# Altium schematic symbol library Electronic Devices_LIB.SchLib: 703 symbols (part 6 of 8) (continued)
## PROT_FUSES_1.5A_32V_0603_F0603E1R50FSTR
designator F?, comment F0603E1R50FSTR
F0603E Series Fast Acting 32 V 1.5 A 0603 Surface Mount Thin-Film Fuse; Manufacturer: Kyocera AVX; Current Rating: 1.5A; Voltage Rating (DC): 32V; Resistance: 60mR; Fuse Type: Board Mount (Cartridge Style Excluded); Approvals: UL; Supplier 1: Digi-Key; Manufacturer Part Number: F0603E1R50FSTR; RoHS: Yes; Category: Fuses; Stock 1: 29130; Pricing 1: 1=0.37, 5=0.362, 10=0.35, 50=0.2944, 100=0.2444, 250=0.2222, 500=0.18888, 1000=0.16665 (USD); Mount: Surface Mount; Case/Package: 0603; Number of Pins: 2; Case Code (Metric): 1608; Case Code (Imperial): 0603; Terminal Material: Nickel; Min Operating Temperature: -55°C; Max Operating Temperature: 125°C; Max Voltage Rating (DC): 32V; Series: Accu-Guard® II; Packaging: Tape and Reel; Voltage Rating: 32V; Package Quantity: 3000; Termination: SMD/SMT; DC Cold Resistance: 60mR; Voltage Rating (AC): 32V; Length: 1.6mm; Width: 0.81mm; Height: 0.63mm; Depth: 0.81mm; Radiation Hardening: No; Lead Free: Lead Free; RoHS Compliant: Yes; ComponentLink1URL: https://datasheet.ciiva.com/301/accug2-301336.pdf?src-supplier=Digi-Key; ComponentLink1Description: https://datasheet.ciiva.com/301/accug2-301336.pdf?src-supplier=Digi-Key; ComponentLink2URL: https://datasheet.ciiva.com/301/accug2-301337.pdf?src-supplier=Digi-Key; ComponentLink2Description: https://datasheet.ciiva.com/301/accug2-301337.pdf?src-supplier=Digi-Key; ComponentLink3URL: https://datasheet.ciiva.com/301/accug2-301338.pdf?src-supplier=Digi-Key; ComponentLink3Description: https://datasheet.ciiva.com/301/accug2-301338.pdf?src-supplier=Digi-Key; ComponentLink4URL: https://datasheet.ciiva.com/3017/fuses-3017734.pdf?src-supplier=Avnet; ComponentLink4Description: https://datasheet.ciiva.com/3017/fuses-3017734.pdf?src-supplier=Avnet; ComponentLink5URL: https://datasheet.ciiva.com/30017/fuses-30017246.pdf?src-supplier=Avnet; ComponentLink5Description: https://datasheet.ciiva.com/30017/fuses-30017246.pdf?src-supplier=Avnet; Supplier Part Number 1: 478-2864-1-ND
footprint PROT_FUSE_FUSC1608X71N (SMD 0603 (1.60mm x 0.81mm x 0.63mm)
pins: 1, 2

## PROT_FUSES_32V_7A_0440007.WR
designator F?, comment 0440007.WR
Fuse Chip Fast Acting 7A 32V SMD Solder Pad 1206 Ceramic T/R CSA/UL; Manufacturer: Littelfuse; Fuse Type: Board Mount (Cartridge Style Excluded); Resistance: 7.94mR; DC Cold Resistance: 7.53mR; Supplier 1: Digikey; Manufacturer Part Number: 0440007.WR; RoHS: Yes; Category: Fuses; Stock 1: 4696; Pricing 1: 1=1.09, 5=1.056, 10=0.989, 50=0.818, 100=0.6818, 250=0.66472, 500=0.56244, 1000=0.49427 (USD); Mount: Surface Mount; Case/Package: 1206; Case Code (Metric): 3216; Case Code (Imperial): 1206; Body Material: Ceramic; Terminal Material: Nickel; Min Operating Temperature: -55°C; Max Operating Temperature: 150°C; Voltage Rating (AC): 32V; Voltage Rating (DC): 32V; Packaging: Tape and Reel; Series: 440; Package Quantity: 3000; Current Rating: 7A; Voltage Rating: 32V; Termination: SMD/SMT; Fuse Current: 7A; Length: 3.2mm; Width: 1.63mm; Height: 0.8mm; RoHS Compliant: Yes; Reach SVHC Compliant: No; ComponentLink1URL: https://datasheet.ciiva.com/299/littelfuse-fuse-440-datasheet-299438.pdf?src-supplier=Digikey; ComponentLink1Description: https://datasheet.ciiva.com/299/littelfuse-fuse-440-datasheet-299438.pdf?src-supplier=Digikey; ComponentLink2URL: https://datasheet.ciiva.com/299/littelfuse-fuse-440-datasheet-299439.pdf?src-supplier=Digikey; ComponentLink2Description: https://datasheet.ciiva.com/299/littelfuse-fuse-440-datasheet-299439.pdf?src-supplier=Digikey; ComponentLink3URL: https://datasheet.ciiva.com/299/littelfuse-fuse-440-datasheet-299440.pdf?src-supplier=Digikey; ComponentLink3Description: https://datasheet.ciiva.com/299/littelfuse-fuse-440-datasheet-299440.pdf?src-supplier=Digikey; ComponentLink4URL: https://datasheet.ciiva.com/7991/littelfuse-fuse-440-datasheet-7991870.pdf?src-supplier=Element14; ComponentLink4Description: https://datasheet.ciiva.com/7991/littelfuse-fuse-440-datasheet-7991870.pdf?src-supplier=Element14; Supplier Part Number 1: F1609CT-ND
footprint FUSE_32V_7A (FUSE_3P4X1P8)
pins: 1, 2

## PROT_TVS_DIODE_DLPT05-7-F
designator D?, comment DLPT05-7-F
DLPT05 Series 300 W 6 V Surface Mount Uni-Directional TVS Diode - SOT-23; Manufacturer: Diodes; Direction: Unidirectional; Capacitance: 1.9pF; Max Surge Current: 17A; Number of Elements: 1; Reverse Breakdown Voltage: 6V; Reverse Standoff Voltage: 5V; Clamping Voltage: 9.8V; Peak Pulse Power: 300W; Power Line Protection: Yes; Number of Channels: 2; Leakage Current: 20uA; Test Current: 1mA; Supplier 1: Digi-Key; Manufacturer Part Number: DLPT05-7-F; RoHS: Yes; Category: TVS Diodes; Stock 1: 567731; Pricing 1: 1=0.39, 10=0.291, 100=0.1815, 500=0.1242, 1000=0.09555 (USD); Mount: Surface Mount; Case/Package: SOT-23-3; Number of Pins: 3; Min Operating Temperature: -55°C; Max Operating Temperature: 150°C; Package Quantity: 3000; Packaging: Tape and Reel; Min Breakdown Voltage: 6V; Polarity: Unidirectional; Termination: SMD/SMT; Working Voltage: 5V; Breakdown Voltage: 6V; Max Power Dissipation: 300W; Power Dissipation: 300W; Peak Pulse Current: 17A; ESD Protection: Yes; Max Reverse Leakage Current: 20uA; Voltage Rating (DC): 6V; Series: -; Clamping Voltage-Max: 9.8V; Number of Unidirectional Channels: 1; Length: 1.3mm; Width: 2.9mm; Height: 1mm; Depth: 1.3mm; Radiation Hardening: No; Reach SVHC Compliant: Yes; Lead Free: Lead Free; RoHS Compliant: Yes; ComponentLink1URL: https://datasheet.ciiva.com/334/ds30310-334816.pdf?src-supplier=Digi-Key; ComponentLink1Description: https://datasheet.ciiva.com/334/ds30310-334816.pdf?src-supplier=Digi-Key; ComponentLink2URL: https://datasheet.ciiva.com/11195/ds30310-11195403.pdf?src-supplier=Avnet; ComponentLink2Description: https://datasheet.ciiva.com/11195/ds30310-11195403.pdf?src-supplier=Avnet; ComponentLink3URL: https://datasheet.ciiva.com/15143/getdatasheetpartid-40673-15143067.pdf?src-supplier=Verical; ComponentLink3Description: https://datasheet.ciiva.com/15143/getdatasheetpartid-40673-15143067.pdf?src-supplier=Verical; ComponentLink4URL: https://datasheet.ciiva.com/11195/ds30310-11195276.pdf?src-supplier=Avnet; ComponentLink4Description: https://datasheet.ciiva.com/11195/ds30310-11195276.pdf?src-supplier=Avnet; ComponentLink5URL: https://datasheet.ciiva.com/16386/ds30310-16386443.pdf?src-supplier=Future+Electronics; ComponentLink5Description: https://datasheet.ciiva.com/16386/ds30310-16386443.pdf?src-supplier=Future+Electronics; Supplier Part Number 1: DLPT05-FDICT-ND
footprint SOT96P240X100-3N (TO-236-3, SC-59, SOT-23-3)
pins: 1 LINE_TO_BE_PROTECTED, 2 VCC, 3 GROUND

## RECTIFIER_BRIDGE_HLK-PM01
designator BR?, comment HLK-PM01
Plugin AC-DC Power Modules ROHS; Manufacturer: HI-LINK; Manufacturer part number: HLK-PM01; ComponentLink1Description: Supplier; ComponentLink1URL: https://www.lcsc.com/product-detail/AC-DC-Power-Modules_HI-LINK-HLK-PM01_C209903.html?utm_source=octopart&utm_medium=cpc&utm_campaign=HLK-PM01
footprint BR_HLKPM01
pins: 1 AC_1, 2 AC_2, 3 -V0, 4 +V0

## RES_0.1R_1%_100mW_0603
designator R?, comment ERJ-3RSFR10V  Resistance: 100mR  Tolerance: 1%  Case Code (Imperial): 0603
SMD Chip Resistor, 100 Milliohm, ± 1%, 100 mW, 0603 [1608 Metric], Thick Film, High Power; Manufacturer: Panasonic; Temperature Coefficient: 300ppm/°C; Power Rating: 100mW; Supplier 1: Digi-Key; Manufacturer Part Number: ERJ-3RSFR10V; RoHS: Yes; Category: Chip SMD Resistors; Stock 1: 390821; Pricing 1: 1=0.27, 10=0.229, 25=0.1664, 50=0.1206, 100=0.0895, 250=0.06864, 500=0.0541, 1000=0.03745 (USD); Mount: Surface Mount; Case/Package: 0603; Number of Pins: 2; Contact Plating: Tin; Case Code (Metric): 1608; Size Code: 0603; Min Operating Temperature: -55°C; Max Operating Temperature: 125°C; Resistor Type: Thick Film; Packaging: Tape and Reel; Package Quantity: 5000; Number of Terminations: 2; Termination: SMD/SMT; Max Power Dissipation: 100mW; Series: ERJ; Resistance Tolerance: 1%; Construction: Rectangular; Technology: THICK FILM; Features: Automotive AEC-Q200; Length: 1.6mm; Width: 0.8mm; Height: 0.45mm; Depth: 0.8mm; Ratings: AEC-Q200; Reach SVHC Compliant: No; Military Standard: Not; Lead Free: Lead Free; RoHS Compliant: Yes; ComponentLink1URL: https://datasheet.ciiva.com/11818/0900766b80eefa12-11818379.pdf?src-supplier=Rs; ComponentLink1Description: https://datasheet.ciiva.com/11818/0900766b80eefa12-11818379.pdf?src-supplier=Rs; ComponentLink2URL: https://datasheet.ciiva.com/9186/aoa0000ce3-9186678.pdf?src-supplier=Avnet; ComponentLink2Description: https://datasheet.ciiva.com/9186/aoa0000ce3-9186678.pdf?src-supplier=Avnet; ComponentLink3URL: https://datasheet.ciiva.com/6137/391509-6137623.pdf?src-supplier=Farnell; ComponentLink3Description: https://datasheet.ciiva.com/6137/391509-6137623.pdf?src-supplier=Farnell; ComponentLink4URL: https://datasheet.ciiva.com/30245/6aoa0000ce3-30245798.pdf?src-supplier=Onlinecomponents.com; ComponentLink4Description: https://datasheet.ciiva.com/30245/6aoa0000ce3-30245798.pdf?src-supplier=Onlinecomponents.com; ComponentLink5URL: https://datasheet.ciiva.com/16396/aoa0000ce3-16396839.pdf?src-supplier=Future+Electronics; ComponentLink5Description: https://datasheet.ciiva.com/16396/aoa0000ce3-16396839.pdf?src-supplier=Future+Electronics; ComponentLink6URL: https://datasheet.ciiva.com/24027/aoa0000ce3-72189-24027996.pdf?src-supplier=Mouser; ComponentLink6Description: https://datasheet.ciiva.com/24027/aoa0000ce3-72189-24027996.pdf?src-supplier=Mouser; ComponentLink7URL: https://datasheet.ciiva.com/28577/391509-28577782.pdf?src-supplier=Element14; ComponentLink7Description: https://datasheet.ciiva.com/28577/391509-28577782.pdf?src-supplier=Element14; ComponentLink8URL: https://datasheet.ciiva.com/28667/391509-28667695.pdf?src-supplier=Element14; ComponentLink8Description: https://datasheet.ciiva.com/28667/391509-28667695.pdf?src-supplier=Element14; ComponentLink9URL: https://datasheet.ciiva.com/46449/391509-46449485.pdf?src-supplier=Element14; ComponentLink9Description: https://datasheet.ciiva.com/46449/391509-46449485.pdf?src-supplier=Element14; ComponentLink10URL: https://datasheet.ciiva.com/46449/391509-46449486.pdf?src-supplier=Element14; ComponentLink10Description: https://datasheet.ciiva.com/46449/391509-46449486.pdf?src-supplier=Element14; ComponentLink11URL: https://datasheet.ciiva.com/16771/70068852-16771902.pdf?src-supplier=Allied+Electronics; ComponentLink11Description: https://datasheet.ciiva.com/16771/70068852-16771902.pdf?src-supplier=Allied+Electronics; Supplier Part Number 1: P.10AJDKR-ND
footprint RES_0603_RESC1608X04N (Chip Resistor, 2-Leads, Body 1.60x0.80mm, IPC Medium Density)
pins: 1, 2

## RES_0.13R_1%_125mW_0805
designator R?, comment Tolerance: 1%  Resistance: 0.13R  Case/Package: 0805  (hidden comment: RL0805FR-070R13L)
Res Thick Film 0805 0.13 Ohm 1% 0.125W(1/8W) ±600ppm/C Pad SMD Automotive T/R; Manufacturer: Yageo; Power Rating: 125mW; Temperature Coefficient: 600ppm/°C; Voltage Rating (DC): 300V; Supplier 1: Digi-Key; Manufacturer Part Number: RL0805FR-070R13L; RoHS: Yes; Category: Chip SMD Resistors; Stock 1: 37545; Pricing 1: 1=0.39, 10=0.204, 50=0.1398, 100=0.1204, 500=0.0884, 1000=0.0783 (USD); Case Code (Metric): 2012; Case Code (Imperial): 0805; Weight: 0.000194oz; Min Operating Temperature: -55°C; Max Operating Temperature: 155°C; Package Quantity: 1; Packaging: Tape and Reel; Number of Terminations: 2; Termination: SMD/SMT; Max Power Dissipation: 125mW; Features: Moisture Resistant,Automotive AEC-Q200; Series: RL; Technology: THICK FILM; Length: 0.079inch; Width: 0.049inch; Height: 0.024inch; Height - Seated (Max): 0.024inch; Lead Free: Lead Free; RoHS Compliant: Yes; ComponentLink1URL: http://www.mouser.com/ds/2/447/PYu-RL_521_RoHS_L_5-2927.pdf?src-supplier=Mouser; ComponentLink1Description: http://www.mouser.com/ds/2/447/PYu-RL_521_RoHS_L_5-2927.pdf?src-supplier=Mouser; ComponentLink2URL: https://www.yageo.com/upload/media/product/productsearch/datasheet/rchip/PYu-RL_Group_521_RoHS_L_2.pdf?src-supplier=Digi-Key; ComponentLink2Description: https://www.yageo.com/upload/media/product/productsearch/datasheet/rchip/PYu-RL_Group_521_RoHS_L_2.pdf?src-supplier=Digi-Key; ComponentLink3URL: http://www.yageo.com/exep/pages/download/literatures/R-chip_current%20sensor_20140512.pdf?src-supplier=Digi-Key; ComponentLink3Description: http://www.yageo.com/exep/pages/download/literatures/R-chip_current%20sensor_20140512.pdf?src-supplier=Digi-Key; ComponentLink4URL: http://www.yageo.com/documents/recent/PYu-RL_Group_521_RoHS_L_2.pdf?src-supplier=Digi-Key; ComponentLink4Description: http://www.yageo.com/documents/recent/PYu-RL_Group_521_RoHS_L_2.pdf?src-supplier=Digi-Key; ComponentLink5URL: https://datasheet.octopart.com/RL0805FR-070R13L-Yageo-datasheet-83209227.pdf?src-supplier=Future+Electronics; ComponentLink5Description: https://datasheet.octopart.com/RL0805FR-070R13L-Yageo-datasheet-83209227.pdf?src-supplier=Future+Electronics; Supplier Part Number 1: 311-.13SCT-ND
footprint RES_0805_RESC2012X06N (Chip Resistor, 2-Leads, Body 2.00x1.25mm, IPC Medium Density)
pins: 1, 2

## RES_0R_1%_100mW_0603
designator R?, comment Tolerance: 1%  Resistance: 0R  Case Code (Imperial): 0603  (hidden comment: RC0603FR-070RL)
RC Series 0603 0.1 W 0 Ohm Jumper Surface Mount Thick Film Chip Resistor; Manufacturer: Yageo; Power Rating: 100mW; Voltage Rating (DC): 50V; Temperature Coefficient: 200ppm/°C; Current Rating: 1A; Working Voltage: 75V; Supplier 1: Digi-Key; Manufacturer Part Number: RC0603FR-070RL; RoHS: Yes; Category: Chip SMD Resistors; Stock 1: 2843917; Pricing 1: 1=0.10000, 10=0.01800, 25=0.01320, 50=0.01000, 100=0.00730, 250=0.00560, 500=0.00448, 1000=0.00329 (USD); Case/Package: 0603; Number of Pins: 2; Contact Plating: Tin,Matte; Case Code (Metric): 1608; Min Operating Temperature: -55°C; Max Operating Temperature: 155°C; Packaging: Tape and Reel; Resistor Type: Thick Film; Package Quantity: 5000; Voltage Rating: 50V; Number of Terminations: 2; Termination: SMD/SMT; Max Power Dissipation: 100mW; Features: Moisture Resistant; Series: RC; Construction: Rectangular; Resistance Tolerance: 1%; Technology: THICK FILM; Length: 1.6mm; Width: 0.8mm; Height: 0.45mm; Depth: 0.8mm; Radiation Hardening: No; Reach SVHC Compliant: Yes; Lead Free: Lead Free; RoHS Compliant: Yes; Military Standard: Not; ComponentLink1URL: https://datasheet.ciiva.com/11808/0900766b80f96399-11808172.pdf?src-supplier=Rs; ComponentLink1Description: https://datasheet.ciiva.com/11808/0900766b80f96399-11808172.pdf?src-supplier=Rs; ComponentLink2URL: https://datasheet.ciiva.com/5684/443971-5684699.pdf?src-supplier=Farnell; ComponentLink2Description: https://datasheet.ciiva.com/5684/443971-5684699.pdf?src-supplier=Farnell; ComponentLink3URL: https://datasheet.ciiva.com/7983/443971-7983627.pdf?src-supplier=Element14; ComponentLink3Description: https://datasheet.ciiva.com/7983/443971-7983627.pdf?src-supplier=Element14; ComponentLink4URL: https://datasheet.ciiva.com/22643/1868787-22643388.pdf?src-supplier=Element14; ComponentLink4Description: https://datasheet.ciiva.com/22643/1868787-22643388.pdf?src-supplier=Element14; ComponentLink5URL: https://datasheet.ciiva.com/46382/443971-46382072.pdf?src-supplier=Element14; ComponentLink5Description: https://datasheet.ciiva.com/46382/443971-46382072.pdf?src-supplier=Element14; ComponentLink6URL: https://datasheet.ciiva.com/29721/pyu-r-int-thick-7-29721178.pdf?src-supplier=Digi-Key; ComponentLink6Description: https://datasheet.ciiva.com/29721/pyu-r-int-thick-7-29721178.pdf?src-supplier=Digi-Key; ComponentLink7URL: https://datasheet.ciiva.com/29721/pyu-rc0603-51-rohs-l-4-29721179.pdf?src-supplier=Digi-Key; ComponentLink7Description: https://datasheet.ciiva.com/29721/pyu-rc0603-51-rohs-l-4-29721179.pdf?src-supplier=Digi-Key; ComponentLink8URL: https://datasheet.ciiva.com/5558/rc0603-272842-5558341.pdf?src-supplier=Mouser; ComponentLink8Description: https://datasheet.ciiva.com/5558/rc0603-272842-5558341.pdf?src-supplier=Mouser; Supplier Part Number 1: 311-0.0HRCT-ND
footprint RES_0603_RESC1608X04N (Chip Resistor, 2-Leads, Body 1.60x0.80mm, IPC Medium Density)
pins: 1, 2

## RES_0R_5%_100mW_0402
designator R?, comment ERJ-2GE0R00X  Case Code (Imperial): 0402  Tolerance: 5%  Resistance: 0R
SMD Chip Resistor, Jumper, 0 ohm, 100 mW, 0402 [1005 Metric], Thick Film, General Purpose; Manufacturer: Panasonic; Power Rating: 100mW; Voltage Rating: 50V; Temperature Coefficient: 600ppm/°C; Supplier 1: Mouser; Manufacturer Part Number: ERJ-2GE0R00X; RoHS: Yes; Category: Chip SMD Resistors; Stock 1: 10989354; Pricing 1: 1=0.1, 10=0.013, 50=0.013, 100=0.006, 1000=0.004, 2500=0.003, 10000=0.003 (USD); Mount: Surface Mount; Case/Package: 0402; Contact Plating: Tin; Case Code (Metric): 1005; Size Code: 0402; Min Operating Temperature: -55°C; Max Operating Temperature: 155°C; Resistor Type: Thick Film; Packaging: Cut Tape; Package Quantity: 10000; Number of Terminations: 2; Termination: SMD/SMT; Max Power Dissipation: 100mW; Voltage Rating (DC): 50V; Features: Automotive AEC-Q200; Series: ERJ; Construction: Rectangular; Technology: THICK FILM; Length: 1mm; Width: 0.5mm; Height: 0.35mm; Depth: 0.5mm; Ratings: AEC-Q200; Radiation Hardening: No; Reach SVHC Compliant: No; Military Standard: Not; Lead Free: Lead Free; RoHS Compliant: Yes; ComponentLink1URL: https://datasheet.ciiva.com/11821/0900766b80f806dd-11821176.pdf?src-supplier=Rs; ComponentLink1Description: https://datasheet.ciiva.com/11821/0900766b80f806dd-11821176.pdf?src-supplier=Rs; ComponentLink2URL: https://datasheet.ciiva.com/43460/1678796-43460347.pdf?src-supplier=Farnell; ComponentLink2Description: https://datasheet.ciiva.com/43460/1678796-43460347.pdf?src-supplier=Farnell; ComponentLink3URL: https://datasheet.ciiva.com/46389/1678796-46389518.pdf?src-supplier=Element14; ComponentLink3Description: https://datasheet.ciiva.com/46389/1678796-46389518.pdf?src-supplier=Element14; ComponentLink4URL: https://datasheet.ciiva.com/5959/1678796-5959692.pdf?src-supplier=Farnell; ComponentLink4Description: https://datasheet.ciiva.com/5959/1678796-5959692.pdf?src-supplier=Farnell; ComponentLink5URL: https://datasheet.ciiva.com/28695/1678796-28695758.pdf?src-supplier=Element14; ComponentLink5Description: https://datasheet.ciiva.com/28695/1678796-28695758.pdf?src-supplier=Element14; ComponentLink6URL: https://datasheet.ciiva.com/16783/70260739-16783734.pdf?src-supplier=Allied+Electronics; ComponentLink6Description: https://datasheet.ciiva.com/16783/70260739-16783734.pdf?src-supplier=Allied+Electronics; ComponentLink7URL: https://datasheet.ciiva.com/16778/70260739-16778335.pdf?src-supplier=Allied+Electronics; ComponentLink7Description: https://datasheet.ciiva.com/16778/70260739-16778335.pdf?src-supplier=Allied+Electronics; ComponentLink8URL: https://datasheet.ciiva.com/48531/aoa0000ce1-48531077.pdf?src-supplier=Avnet; ComponentLink8Description: https://datasheet.ciiva.com/48531/aoa0000ce1-48531077.pdf?src-supplier=Avnet; ComponentLink9URL: https://datasheet.ciiva.com/30097/4aoa0000ce1-30097116.pdf?src-supplier=Onlinecomponents.com; ComponentLink9Description: https://datasheet.ciiva.com/30097/4aoa0000ce1-30097116.pdf?src-supplier=Onlinecomponents.com; Supplier Part Number 1: 667-ERJ-2GE0R00X
footprint RES_0402_RESC1005X04N (Chip Resistor, 2-Leads, Body 1.02x0.53mm, IPC Medium Density)
pins: 1, 2

## RES_0R_5%_125mW_0805
designator R?, comment Tolerance: 5%  Resistance: 0R  Case/Package: 0805  (hidden comment: RC0805JR-070RL)
GENERAL PURPOSE CHIP RESISTOR Metal Glaze/thick Film, 0.125W, 0ohm, Surface Mount, 0805; Manufacturer: Yageo; Power Rating: 125mW; Voltage Rating: 150V; Temperature Coefficient: 200ppm/°C; Supplier 1: Digikey; Manufacturer Part Number: RC0805JR-070RL; RoHS: Yes; Category: Chip SMD Resistors; Stock 1: 571904; Pricing 1: 1=0.1, 10=0.027, 25=0.0204, 50=0.0156, 100=0.0109, 250=0.00876, 500=0.00702, 1000=0.00517 (USD); Number of Pins: 2; Case Code (Imperial): 0805; Case Code (Metric): 2012; Contact Plating: Tin,Matte; Size Code: 0805; Min Operating Temperature: -55°C; Max Operating Temperature: 155°C; Packaging: Tape and Reel; Voltage Rating (DC): 150V; Termination: SMD/SMT; Resistor Type: Thick Film; Features: Moisture Resistant; Series: RC; Max Power Dissipation: 125mW; Number of Terminations: 2; Construction: Rectangular; Technology: THICK FILM; Resistance Tolerance: 5%; Length: 2mm; Width: 1.25mm; Height: 0.5mm; Depth: 1.25mm; Military Standard: Not; Lead Free: Lead Free; RoHS Compliant: Yes; Reach SVHC Compliant: Unknown; ComponentLink1URL: https://datasheet.ciiva.com/7941/1738694-7941861.pdf?src-supplier=Element14; ComponentLink1Description: https://datasheet.ciiva.com/7941/1738694-7941861.pdf?src-supplier=Element14; ComponentLink2URL: https://datasheet.ciiva.com/11819/0900766b8106beab-11819430.pdf?src-supplier=Rs; ComponentLink2Description: https://datasheet.ciiva.com/11819/0900766b8106beab-11819430.pdf?src-supplier=Rs; ComponentLink3URL: https://datasheet.ciiva.com/7941/1738694-7941862.pdf?src-supplier=Element14; ComponentLink3Description: https://datasheet.ciiva.com/7941/1738694-7941862.pdf?src-supplier=Element14; ComponentLink4URL: https://datasheet.ciiva.com/7941/1738694-7941863.pdf?src-supplier=Element14; ComponentLink4Description: https://datasheet.ciiva.com/7941/1738694-7941863.pdf?src-supplier=Element14; ComponentLink5URL: https://datasheet.ciiva.com/15190/getdatasheetpartid-330685-15190028.pdf?src-supplier=Verical; ComponentLink5Description: https://datasheet.ciiva.com/15190/getdatasheetpartid-330685-15190028.pdf?src-supplier=Verical; Supplier Part Number 1: 311-0.0ARCT-ND
footprint RES_0805_RESC2012X06N (Chip Resistor, 2-Leads, Body 2.00x1.25mm, IPC Medium Density)
pins: 1, 2

## RES_1.01K_0.1%_100mW_0603
designator R?, comment Tolerance: 0.1%  Resistance: 1.01K  Case/Package: 0603  (hidden comment: RT0603BRD071K01L)
Res High precision Thin Film 0603 1.01K Ohm 0.1% 1/10W ±25ppm/°C Molded SMD Paper T/R; Manufacturer: Yageo; Max Power Dissipation: 100mW; Supplier 1: Digi-Key; Manufacturer Part Number: RT0603BRD071K01L; RoHS: Yes; Category: Chip SMD Resistors; Stock 1: 12547; Pricing 1: 1=0.33, 10=0.277, 50=0.1462, 100=0.1084, 500=0.06552, 1000=0.04536 (USD); Min Operating Temperature: -55°C; Max Operating Temperature: 155°C; Packaging: Tape and Reel; Number of Terminations: 2; Temperature Coefficient: 25ppm/°C; Features: Moisture Resistant; Series: RT; Length: 0.063inch; Width: 0.031inch; Height: 0.022inch; RoHS Compliant: Yes; ComponentLink1URL: http://www.yageo.com/documents/recent/PYu-RT_1-to-0.01_RoHS_L_9.pdf?src-supplier=Digi-Key; ComponentLink1Description: http://www.yageo.com/documents/recent/PYu-RT_1-to-0.01_RoHS_L_9.pdf?src-supplier=Digi-Key; Supplier Part Number 1: YAG4489CT-ND
footprint RES_0603_RESC1608X04N (Chip Resistor, 2-Leads, Body 1.60x0.80mm, IPC Medium Density)
pins: 1, 2

## RES_1.2K_5%_100mW_0603
designator R?, comment Resistance Tolerance: 5%  Resistance: 1.2K  Case/Package: 0603  (hidden comment: RC0603JR-071K2L)
Res Thick Film 0603 1.2K Ohm 5% 0.1W(1/10W) ±100ppm/°C Pad SMD T/R; Manufacturer: Yageo; Voltage Rating (DC): 50V; Power Rating: 100mW; Supplier 1: Digi-Key; Manufacturer Part Number: RC0603JR-071K2L; RoHS: Yes; Category: Chip SMD Resistors; Stock 1: 471631; Pricing 1: 1=0.1, 10=0.014, 50=0.0088, 100=0.0073, 500=0.00486, 1000=0.00415 (USD); Number of Pins: 2; Case Code (Imperial): 0603; Case Code (Metric): 1608; Size Code: 0603; Min Operating Temperature: -55°C; Max Operating Temperature: 155°C; Tolerance: 5%; Resistor Type: Thick Film; Temperature Coefficient: 100ppm/°C; Packaging: Tape and Reel; Package Quantity: 1; Voltage Rating: 50V; Termination: SMD/SMT; Number of Terminations: 2; Max Power Dissipation: 100mW; Features: Moisture Resistant; Series: RC; Length: 0.063inch; Width: 0.031inch; Height: 0.022inch; Reach SVHC Compliant: No; Lead Free: Lead Free; RoHS Compliant: Yes; ComponentLink1URL: https://datasheet.ciiva.com/2452/pyu-r-int-thick-7-2452872.pdf?src-supplier=Digi-Key; ComponentLink1Description: https://datasheet.ciiva.com/2452/pyu-r-int-thick-7-2452872.pdf?src-supplier=Digi-Key; ComponentLink2URL: https://datasheet.ciiva.com/2452/pyu-r-int-thick-7-2452873.pdf?src-supplier=Digi-Key; ComponentLink2Description: https://datasheet.ciiva.com/2452/pyu-r-int-thick-7-2452873.pdf?src-supplier=Digi-Key; ComponentLink3URL: https://datasheet.ciiva.com/2452/pyu-r-int-thick-7-2452874.pdf?src-supplier=Digi-Key; ComponentLink3Description: https://datasheet.ciiva.com/2452/pyu-r-int-thick-7-2452874.pdf?src-supplier=Digi-Key; ComponentLink4URL: https://datasheet.ciiva.com/7746/443971-7746456.pdf?src-supplier=Element14; ComponentLink4Description: https://datasheet.ciiva.com/7746/443971-7746456.pdf?src-supplier=Element14; ComponentLink5URL: https://datasheet.ciiva.com/7746/443971-7746455.pdf?src-supplier=Element14; ComponentLink5Description: https://datasheet.ciiva.com/7746/443971-7746455.pdf?src-supplier=Element14; Supplier Part Number 1: 311-1.2KGRDKR-ND
footprint RES_0603_RESC1608X04N (Chip Resistor, 2-Leads, Body 1.60x0.80mm, IPC Medium Density)
pins: 1, 2

## RES_1.2M_1%_100mW_0402
designator R?, comment Tolerance: 1%  Resistance: 1.2M  Case/Package: 0402  (hidden comment: RK73H1ETTP1204F)
Res Thick Film 0402 1.2M Ohm 1% 0.1W(1/10W) ±200ppm/C Pad SMD Automotive T/R; Manufacturer: KOA Speer; Power Rating: 63mW; Voltage Rating: 50V; Temperature Coefficient: 100ppm/°C; Supplier 1: Mouser; Manufacturer Part Number: RK73H1ETTP1204F; RoHS: Yes; Category: Chip SMD Resistors; Stock 1: 51337; Pricing 1: 1=0.1, 10=0.015, 50=0.015, 100=0.007, 1000=0.005, 10000=0.003 (USD); Case Code (Imperial): 0402; Case Code (Metric): 1005; Min Operating Temperature: -55°C; Max Operating Temperature: 155°C; Packaging: Tape and Reel; Termination: SMD/SMT; Series: RK73H; Construction: Rectangular; Length: 1mm; Depth: 0.5mm; Military Standard: Not; Lead Free: Lead Free; RoHS Compliant: Yes; ComponentLink1URL: https://datasheet.ciiva.com/5555/rk73h-5555148.pdf?src-supplier=Mouser; ComponentLink1Description: https://datasheet.ciiva.com/5555/rk73h-5555148.pdf?src-supplier=Mouser; Supplier Part Number 1: 660-RK73H1ETTP1204F
footprint RES_0402_RESC1005X04N (Chip Resistor, 2-Leads, Body 1.02x0.53mm, IPC Medium Density)
pins: 1, 2

## RES_1.5K_0.1%_100mW_0603
designator R?, comment ERA-3AEB152V  Tolerance: 0.1%  Resistance: 1.5K  Case/Package: 0603
Res Thin Film 0603 1.5K Ohm 0.1% 0.1W ±25ppm/°C Molded SMD Punched Carrier T/R; Manufacturer: Panasonic; Power Rating: 100mW; Voltage Rating: 75V; Supplier 1: Digi-Key; Manufacturer Part Number: ERA-3AEB152V; RoHS: Yes; Category: Chip SMD Resistors; Stock 1: 32132; Pricing 1: 1=0.31, 10=0.249, 50=0.1382, 100=0.0973, 500=0.06198, 1000=0.0429 (USD); Mount: Surface Mount; Number of Pins: 2; Contact Plating: Tin; Case Code (Metric): 1608; Case Code (Imperial): 0603; Size Code: 0603; Min Operating Temperature: -55°C; Max Operating Temperature: 155°C; Resistor Type: Thin Film; Temperature Coefficient: 25ppm/°C; Packaging: Tape and Reel; Package Quantity: 1; Number of Terminations: 2; Termination: SMD/SMT; Max Power Dissipation: 100mW; Voltage Rating (DC): 75V; Features: Automotive AEC-Q200; Series: ERA-3A; Resistance Tolerance: 0.1%; Technology: METAL FILM; Length: 1.6mm; Width: 0.8mm; Height: 0.45mm; Depth: 0.8mm; Ratings: AEC-Q200; Radiation Hardening: No; Reach SVHC Compliant: No; Lead Free: Lead Free; RoHS Compliant: Yes; ComponentLink1URL: https://datasheet.ciiva.com/11811/0900766b80beefcc-11811712.pdf?src-supplier=Rs; ComponentLink1Description: https://datasheet.ciiva.com/11811/0900766b80beefcc-11811712.pdf?src-supplier=Rs; ComponentLink2URL: https://datasheet.ciiva.com/29183/450830-da-01-en-widerstand-0603-era-29183764.pdf?src-supplier=Conrad; ComponentLink2Description: https://datasheet.ciiva.com/29183/450830-da-01-en-widerstand-0603-era-29183764.pdf?src-supplier=Conrad; ComponentLink3URL: https://datasheet.ciiva.com/9117/aoa0000ce26-9117365.pdf?src-supplier=Avnet; ComponentLink3Description: https://datasheet.ciiva.com/9117/aoa0000ce26-9117365.pdf?src-supplier=Avnet; ComponentLink4URL: https://datasheet.ciiva.com/5734/485442-5734538.pdf?src-supplier=Farnell; ComponentLink4Description: https://datasheet.ciiva.com/5734/485442-5734538.pdf?src-supplier=Farnell; ComponentLink5URL: https://datasheet.ciiva.com/5734/485442-5734539.pdf?src-supplier=Farnell; ComponentLink5Description: https://datasheet.ciiva.com/5734/485442-5734539.pdf?src-supplier=Farnell; ComponentLink6URL: https://datasheet.ciiva.com/46422/485442-46422565.pdf?src-supplier=Element14; ComponentLink6Description: https://datasheet.ciiva.com/46422/485442-46422565.pdf?src-supplier=Element14; ComponentLink7URL: https://datasheet.ciiva.com/16760/70068849-16760629.pdf?src-supplier=Allied+Electronics; ComponentLink7Description: https://datasheet.ciiva.com/16760/70068849-16760629.pdf?src-supplier=Allied+Electronics; ComponentLink8URL: https://datasheet.ciiva.com/7830/485442-7830591.pdf?src-supplier=Element14; ComponentLink8Description: https://datasheet.ciiva.com/7830/485442-7830591.pdf?src-supplier=Element14; ComponentLink9URL: https://datasheet.ciiva.com/28513/485442-28513834.pdf?src-supplier=Element14; ComponentLink9Description: https://datasheet.ciiva.com/28513/485442-28513834.pdf?src-supplier=Element14; ComponentLink10URL: https://datasheet.ciiva.com/30146/54aoa0000ce26-30146117.pdf?src-supplier=Onlinecomponents.com; ComponentLink10Description: https://datasheet.ciiva.com/30146/54aoa0000ce26-30146117.pdf?src-supplier=Onlinecomponents.com; ComponentLink11URL: https://datasheet.ciiva.com/48530/era-eng-tds-48530507.pdf?src-supplier=Distrelec; ComponentLink11Description: https://datasheet.ciiva.com/48530/era-eng-tds-48530507.pdf?src-supplier=Distrelec; Supplier Part Number 1: P1.5KDBCT-ND
footprint RES_0603_RESC1608X04N (Chip Resistor, 2-Leads, Body 1.60x0.80mm, IPC Medium Density)
pins: 1, 2

## RES_1.5K_1%_63mW_0402
designator R?, comment Resistance: 1.5K  Tolerance: 1%  Case/Package: 0402  (hidden comment: CR0402-FX-1501GLF)
Res Thick Film 0402 1.5K Ohm 1% 1/16W ±100ppm/°C Molded SMD SMD Paper Tape on Plastic Reel; Manufacturer: Bourns; Power Rating: 62.5mW; Voltage Rating: 50V; Max Power Dissipation: 63mW; Supplier 1: Digi-Key; Manufacturer Part Number: CR0402-FX-1501GLF; RoHS: Yes; Category: Chip SMD Resistors; Stock 1: 177147; Pricing 1: 1=0.1, 10=0.011, 50=0.0064, 100=0.0051, 500=0.00326, 1000=0.00275, 5000=0.0019 (USD); Mount: Surface Mount; Case Code (Metric): 1005; Case Code (Imperial): 0402; Contact Plating: Tin; Min Operating Temperature: -55°C; Max Operating Temperature: 125°C; Package Quantity: 10000; Packaging: Tape and Reel; Number of Terminations: 2; Termination: SMD/SMT; Temperature Coefficient: 100ppm/°C; Series: CR0402; Voltage Rating (DC): 50V; Length: 0.039inch; Width: 0.5mm; Height: 0.016inch; Thickness: 356um; Radiation Hardening: No; RoHS Compliant: Yes; ComponentLink1URL: https://datasheet.ciiva.com/9123/cr0402-9123423.pdf?src-supplier=Avnet; ComponentLink1Description: https://datasheet.ciiva.com/9123/cr0402-9123423.pdf?src-supplier=Avnet; ComponentLink2URL: https://datasheet.ciiva.com/30173/cr0402-30173227.pdf?src-supplier=Onlinecomponents.com; ComponentLink2Description: https://datasheet.ciiva.com/30173/cr0402-30173227.pdf?src-supplier=Onlinecomponents.com; Supplier Part Number 1: CR0402-FX-1501GLFCT-ND
footprint RES_0402_RESC1005X04N (Chip Resistor, 2-Leads, Body 1.02x0.53mm, IPC Medium Density)
pins: 1, 2

## RES_1.6M_1%_100mW_0603
designator R?, comment Tolerance: 1%  Resistance: 1.6M  Case/Package: 0603  (hidden comment: RC0603FR-071M6L)
Res Thick Film 0603 1.6M Ohm 1% 0.1W(1/10W) ±100ppm/C Pad SMD T/R; Manufacturer: Yageo; Power Rating: 100mW; Voltage Rating: 50V; Temperature Coefficient: 100ppm/°C; Manufacturer Part Number: RC0603FR-071M6L; RoHS: Yes; Category: Chip SMD Resistors; Stock 1: 39369; Pricing 1: 1=0.10000, 10=0.01900, 100=0.00770, 1000=0.00345, 2500=0.00300 (USD); Case Code (Imperial): 0603; Case Code (Metric): 1608; Min Operating Temperature: -55°C; Max Operating Temperature: 155°C; Packaging: Tape and Reel; Resistor Type: Thick Film; Termination: SMD/SMT; Number of Terminations: 2; Max Power Dissipation: 100mW; Features: Moisture Resistant; Series: RC; Construction: Rectangular; Length: 1.6mm; Width: 0.8mm; Height: 0.022inch; Depth: 0.8mm; Military Standard: Not; RoHS Compliant: Yes; ComponentLink1URL: http://www.mouser.com/ds/2/447/RC0603-272842.pdf?src-supplier=Mouser; ComponentLink1Description: http://www.mouser.com/ds/2/447/RC0603-272842.pdf?src-supplier=Mouser; ComponentLink2URL: http://www.yageo.com/documents/recent/PYu-RC_Group_51_RoHS_L_9.pdf?src-supplier=Digi-Key; ComponentLink2Description: http://www.yageo.com/documents/recent/PYu-RC_Group_51_RoHS_L_9.pdf?src-supplier=Digi-Key; ComponentLink3URL: https://www.yageo.com/upload/media/product/productsearch/datasheet/rchip/PYu-RC_Group_51_RoHS_L_11.pdf?src-supplier=Digi-Key; ComponentLink3Description: https://www.yageo.com/upload/media/product/productsearch/datasheet/rchip/PYu-RC_Group_51_RoHS_L_11.pdf?src-supplier=Digi-Key; Supplier 1: Digi-Key; Supplier 2: Arrow Electronics; Supplier 3: Verical; Supplier Part Number 1: YAG3327CT-ND; Supplier Part Number 2: RC0603FR-071M6L; Supplier Part Number 3: RC0603FR-071M6L
footprint R0603
pins: 1, 2

## RES_1.21K_1%_63mW_0402
designator R?, comment CRCW04021K21FKED  Tolerance: 1%  Resistance: 1.21K  Case/Package: 0402
Res Thick Film 0402 1.21K Ohm 1% 1/16W ±100ppm/°C Molded SMD Paper T/R; Manufacturer: Vishay; Max Power Dissipation: 63mW; Voltage Rating: 50V; Supplier 1: Digikey; Manufacturer Part Number: CRCW04021K21FKED; RoHS: Yes; Category: Chip SMD Resistors; Stock 1: 42081; Pricing 1: 1=0.1, 10=0.026, 50=0.0164, 100=0.0136, 500=0.00918, 1000=0.00789, 5000=0.00576 (USD); Number of Pins: 2; Case Code (Metric): 1005; Case Code (Imperial): 0402; Weight: 2.3E-05oz; Contact Plating: Tin; Size Code: 0402; Min Operating Temperature: -55°C; Max Operating Temperature: 155°C; Packaging: Tape and Reel; Number of Terminations: 2; Temperature Coefficient: 100ppm/°C; Series: CRCW; Package Quantity: 10000; Power Rating: 63mW; Termination: SMD/SMT; Features: Automotive AEC-Q200; Resistor Type: Thick Film; Voltage Rating (DC): 50V; Construction: Rectangular; Technology: THICK FILM; Resistance Tolerance: 1%; Length: 1mm; Width: 0.5mm; Height: 0.35mm; Depth: 0.5mm; Ratings: AEC-Q200; Radiation Hardening: No; RoHS Compliant: Yes; Lead Free: Lead Free; Military Standard: Not; Reach SVHC Compliant: Unknown; ComponentLink1URL: https://datasheet.ciiva.com/11818/0900766b80d98824-11818004.pdf?src-supplier=Rs; ComponentLink1Description: https://datasheet.ciiva.com/11818/0900766b80d98824-11818004.pdf?src-supplier=Rs; ComponentLink2URL: https://datasheet.ciiva.com/2463/dcrcwe3-2463712.pdf?src-supplier=Digikey; ComponentLink2Description: https://datasheet.ciiva.com/2463/dcrcwe3-2463712.pdf?src-supplier=Digikey; ComponentLink3URL: https://datasheet.ciiva.com/2463/dcrcwe3-2463713.pdf?src-supplier=Digikey; ComponentLink3Description: https://datasheet.ciiva.com/2463/dcrcwe3-2463713.pdf?src-supplier=Digikey; ComponentLink4URL: https://datasheet.ciiva.com/2463/dcrcwe3-2463714.pdf?src-supplier=Digikey; ComponentLink4Description: https://datasheet.ciiva.com/2463/dcrcwe3-2463714.pdf?src-supplier=Digikey; ComponentLink5URL: https://datasheet.ciiva.com/3256/dcrcwe3-3256158.pdf?src-supplier=Avnet; ComponentLink5Description: https://datasheet.ciiva.com/3256/dcrcwe3-3256158.pdf?src-supplier=Avnet; ComponentLink6URL: https://datasheet.ciiva.com/3256/dcrcwe3-3256159.pdf?src-supplier=Avnet; ComponentLink6Description: https://datasheet.ciiva.com/3256/dcrcwe3-3256159.pdf?src-supplier=Avnet; ComponentLink7URL: https://datasheet.ciiva.com/16436/dcrcwe3-16436188.pdf?src-supplier=Future+Electronics; ComponentLink7Description: https://datasheet.ciiva.com/16436/dcrcwe3-16436188.pdf?src-supplier=Future+Electronics; ComponentLink8URL: https://datasheet.ciiva.com/16765/70201119-16765014.pdf?src-supplier=Allied+Electronics; ComponentLink8Description: https://datasheet.ciiva.com/16765/70201119-16765014.pdf?src-supplier=Allied+Electronics; ComponentLink9URL: https://datasheet.ciiva.com/7690/1697337-7690653.pdf?src-supplier=Element14; ComponentLink9Description: https://datasheet.ciiva.com/7690/1697337-7690653.pdf?src-supplier=Element14; ComponentLink10URL: https://datasheet.ciiva.com/7690/1533075-7690846.pdf?src-supplier=Element14; ComponentLink10Description: https://datasheet.ciiva.com/7690/1533075-7690846.pdf?src-supplier=Element14; Supplier Part Number 1: 541-1.21KLCT-ND
footprint RES_0402_RESC1005X04N (Chip Resistor, 2-Leads, Body 1.02x0.53mm, IPC Medium Density)
pins: 1, 2

## RES_1K_1%_100mW_0402
designator R?, comment Resistance: 1K  Tolerance: 1%  Case/Package: 0402  (hidden comment: ERJ-2RKF1001X)
RES SMD 1K OHM 1% 1/10W 0402; Manufacturer: Panasonic; Temperature Coefficient: 100ppm/°C; Max Power Dissipation: 100mW; Voltage Rating (DC): 50V; Supplier 1: Digi-Key; Manufacturer Part Number: ERJ-2RKF1001X; RoHS: Yes; Category: Chip SMD Resistors; Stock 1: 2367361; Pricing 1: 1=0.1, 10=0.029, 50=0.0162, 100=0.0119, 500=0.00728, 1000=0.00535, 5000=0.00384 (USD); Mount: Surface Mount; Number of Pins: 2; Case Code (Imperial): 0402; Case Code (Metric): 1005; Contact Plating: Tin; Min Operating Temperature: -55°C; Max Operating Temperature: 155°C; Packaging: Tape and Reel; Number of Terminations: 2; Features: Automotive AEC-Q200; Voltage Rating: 50V; Power Rating: 100mW; Package Quantity: 1; Termination: SMD/SMT; Resistor Type: Thick Film; Series: ERJ; Resistance Tolerance: 1%; Construction: Rectangular; Technology: THICK FILM; Length: 1mm; Width: 0.5mm; Height: 0.35mm; Depth: 0.5mm; Lead Free: Lead Free; RoHS Compliant: Yes; Reach SVHC Compliant: Yes; Military Standard: Not; Supplier Part Number 1: P1.00KLCT-ND
footprint RES_0402_RESC1005X04N (Chip Resistor, 2-Leads, Body 1.02x0.53mm, IPC Medium Density)
pins: 1, 2

## RES_1K_1%_100mW_0603
designator R?, comment Resistance: 1K  Tolerance: 1%  Case/Package: 0603  (hidden comment: AC0603FR-101KL)
Chip Resistor Automotive Grade Thick Film 0603 1kOhm 1% Paper T/R; Manufacturer: Yageo; Voltage Rating: 50V; Temperature Coefficient: 100ppm/°C; Power Rating: 100mW; Manufacturer Part Number: AC0603FR-101KL; RoHS: Yes; Category: Chip SMD Resistors; Stock 1: 108593; Pricing 1: 1=0.10000, 10=0.02500, 100=0.01030, 1000=0.00463, 2500=0.00402, 5000=0.00332 (USD); Case Code (Imperial): 0603; Case Code (Metric): 1608; Min Operating Temperature: -55°C; Max Operating Temperature: 155°C; Packaging: Tape and Reel; Termination: SMD/SMT; Series: AC; Length: 1.6mm; Width: 0.8mm; Height: 0.45mm; RoHS Compliant: Yes; ComponentLink1URL: http://www.mouser.com/ds/2/447/yageodocoutput-1111992.pdf?src-supplier=Mouser; ComponentLink1Description: http://www.mouser.com/ds/2/447/yageodocoutput-1111992.pdf?src-supplier=Mouser; Supplier 1: Digi-Key; Supplier 2: Newark; Supplier 3: Mouser; Supplier Part Number 1: 13-AC0603FR-101KLDKR-ND; Supplier Part Number 2: 31AK9289; Supplier Part Number 3: 603-AC0603FR-101KL
footprint RES_0603_RESC1608X04N (Chip Resistor, 2-Leads, Body 1.60x0.80mm, IPC Medium Density)
pins: 1, 2
